# Altium footprint library North POLE.PcbLib: 419 footprints (part 22 of 27)
Each footprint in its own frame and in the unit in brackets; x right, y up, seen from the top. Pads: shape width x height; smd on the part's side, far side on the other; paste and mask are expansions set on the pad; w line width, h text height; cw(c..) or ccw(c..) is an arc to the next point about the centre after c.
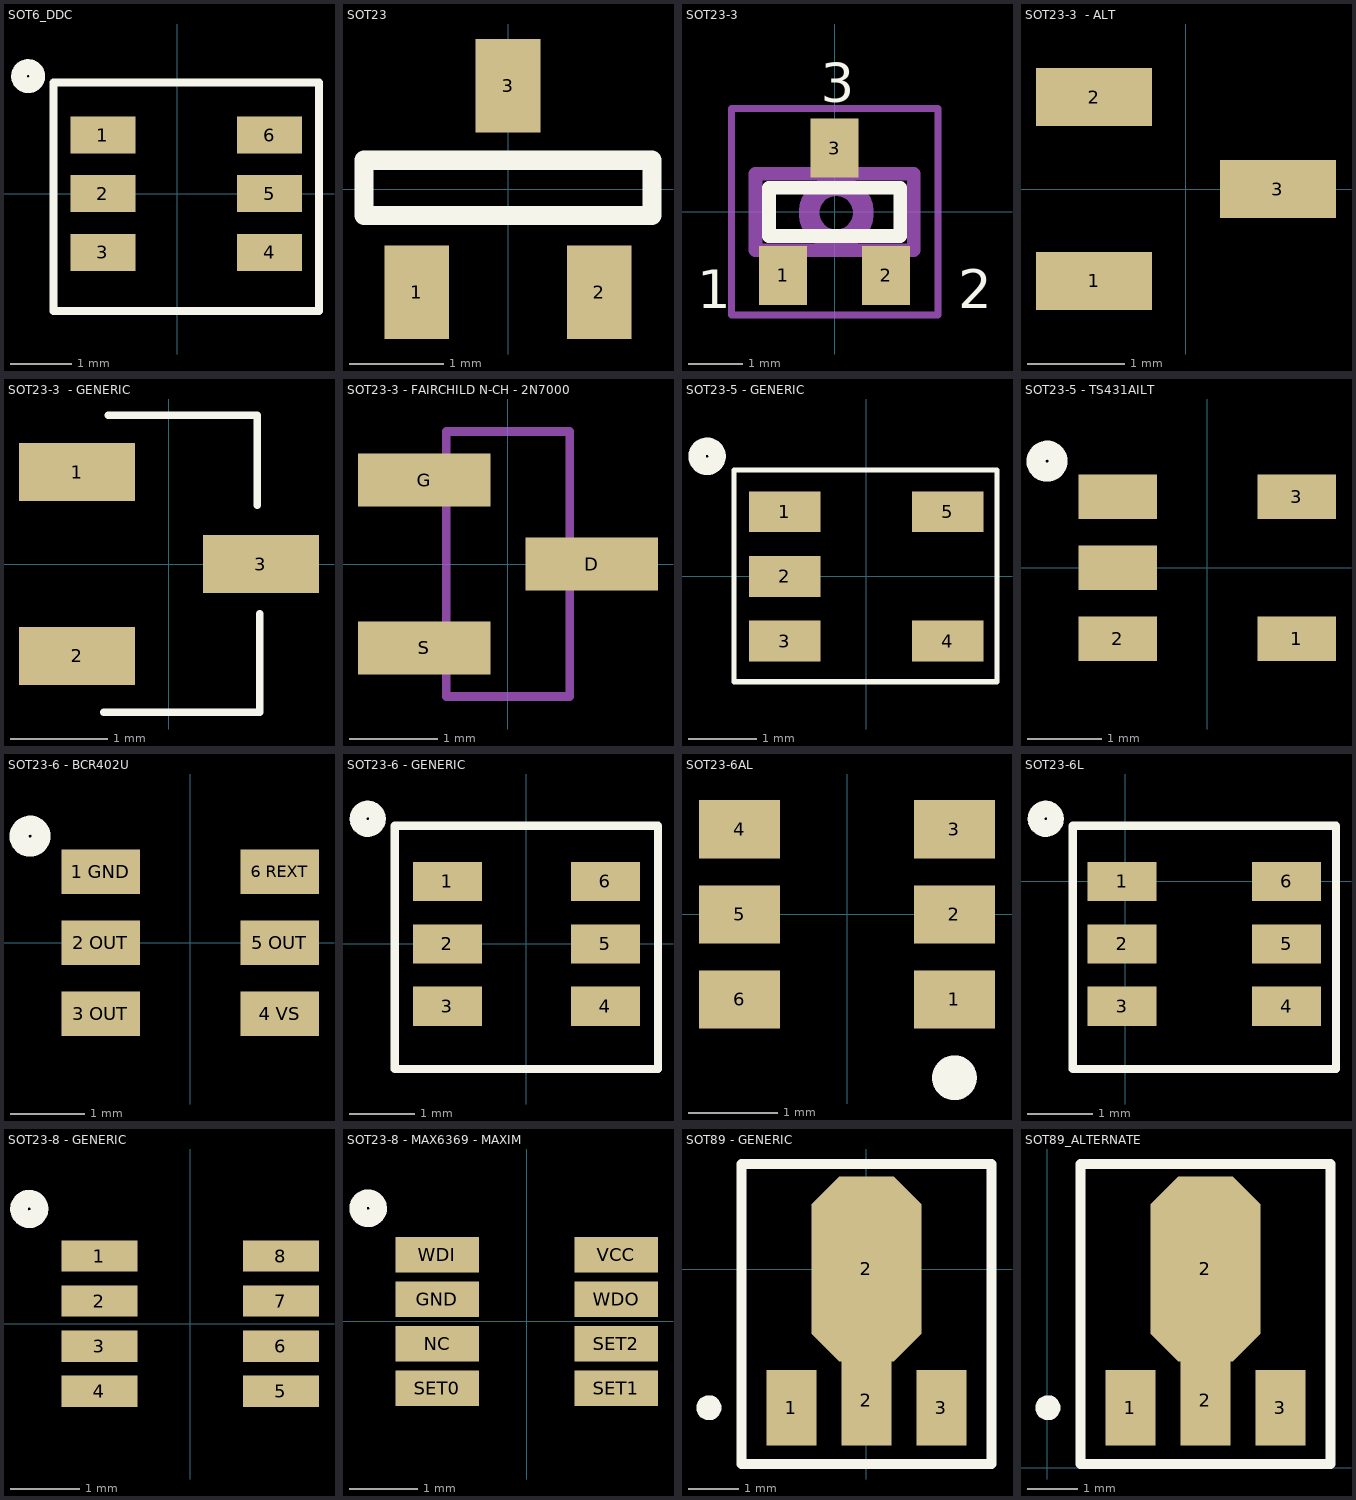
[diagram p21: the footprints below, top view; thin cyan lines are the x and y axes]

## SOT6_DDC [mm]
pads (6):
  rect 1.05x0.6 smd: 1(-1.2,0.95) 2(-1.2,0) 3(-1.2,-0.95) 4(1.5,-0.95) 5(1.5,0.001) 6(1.5,0.95)
Top Overlay:
  lines w0.127: -2,-1.9 2.3,-1.9 2.3,1.8 -2,1.8 -2,-1.9
  lines w0.254: -2.322,2.021 ccw(c-2.412,1.904) -2.3,2
3D body: height 1.3, standoff 0, extent -1.35,-1.5 1.65,1.5

## SOT23 [mil]
pads (3):
  rect 27x39 smd paste-4 mask+5: 1(-38,-43) 2(38,-43) 3(0,43)
Top Overlay:
  lines w8: -60,-11 60,-11 60,12 -60,12 -60,-11
3D body: height 41.34, standoff -1.97, extent -58.06,-47.21 60.05,51.21

## SOT23-3 [mil]
pads (3):
  rect 35x43 smd paste-5 mask+10: 1(-37.4,-46.26) 2(37.4,-46.26) 3(0,46.26)
Top Overlay:
  lines w10: -47.64,-17.72 -47.64,17.32 47.64,17.32 47.64,-17.72 -47.64,-17.72
  text "3" at -10,80 h28
  text "2" at 90,-70 h28
  text "1" at -100,-70 h28
Mechanical 5:
  lines w5: -75,-75 -75,75 75,75 75,-75 -75,-75
Mechanical 6:
  lines w10: -57.48,-27.95 -57.48,27.56 57.48,27.56 57.48,-27.95 -57.48,-27.95
Mechanical 7:
  lines w15: 1.18,-20.47 ccw(c1.18,-0.79) 1.18,18.9 ccw(c1.18,-0.79) 1.18,-20.47

## SOT23-3  - ALT [mm]
pads (3):
  rect 1.2x0.6 smd: 1(-0.95,-0.95) 2(-0.95,0.95) 3(0.95,0)
3D body: height 1.05, standoff 0.03, extent -1.25,-1.46 1.226,1.46

## SOT23-3  - GENERIC [mm]
pads (3):
  rect 1.2x0.6 smd: 1(-0.95,0.95) 2(-0.95,-0.95) 3(0.95,0)
Top Overlay:
  lines w0.076: -0.675,-1.533 0.938,-1.533 0.938,-0.514 ; -0.626,1.536 0.912,1.536 0.912,0.607
3D body: height 1.05, standoff 0.03, extent -1.25,-1.46 1.226,1.46

## SOT23-3 - FAIRCHILD N-CH - 2N7000 [mm]
pads (3):
  rect 1.5x0.6 smd: D(0.95,0) G(-0.95,0.95) S(-0.95,-0.95)
Mechanical 13:
  lines w0.1: -0.7,-1.5 -0.7,1.5 0.7,1.5 0.7,-1.5 -0.7,-1.5
3D body: height 1.1, standoff 0, extent -0.7,-1.5 0.7,1.5

## SOT23-5 - GENERIC [mm]
pads (5):
  rect 1.05x0.6 smd: 1(-1.2,0.95) 2(-1.2,0) 3(-1.2,-0.95) 4(1.2,-0.95) 5(1.2,0.95)
Top Overlay:
  lines w0.076: -1.943,-1.548 -1.943,1.563 1.921,1.563 1.921,-1.548 -1.943,-1.548
  lines w0.254: -2.249,1.882 ccw(c-2.339,1.765) -2.227,1.861
3D body: height 1.3, standoff 0, extent -1.5,-1.499 1.5,1.501

## SOT23-5 - TS431AILT [mm]
pads (5):
  rect 1.05x0.6 smd: 1(1.2,-0.95) 2(-1.2,-0.95) 3(1.2,0.95) ""(-1.2,0) ""(-1.2,0.95)
Top Overlay:
  lines w0.254: -2.054,1.545 ccw(c-2.144,1.428) -2.032,1.524
3D body: height 1.3, standoff 0, extent -1.5,-1.499 1.5,1.501

## SOT23-6 - BCR402U [mm]
pads (6):
  rect 1.05x0.6 smd: "1 GND"(-1.2,0.95) "2 OUT"(-1.2,0) "3 OUT"(-1.2,-0.95) "4 VS"(1.2,-0.95) "5 OUT"(1.2,0) "6 REXT"(1.2,0.95)
Top Overlay:
  lines w0.254: -2.054,1.545 ccw(c-2.144,1.428) -2.032,1.524
3D body: height 1.3, standoff 0, extent -1.5,-1.499 1.5,1.501

## SOT23-6 - GENERIC [mm]
pads (6):
  rect 1.05x0.6 smd: 1(-1.2,0.95) 2(-1.2,0) 3(-1.2,-0.95) 4(1.2,-0.95) 5(1.2,0) 6(1.2,0.95)
Top Overlay:
  lines w0.127: -2,-1.9 2,-1.9 2,1.8 -2,1.8 -2,-1.9
  lines w0.254: -2.322,2.021 ccw(c-2.412,1.904) -2.3,2
3D body: height 1.3, standoff 0, extent -1.5,-1.499 1.5,1.501

## SOT23-6AL [mm] "SOT23, 5-Leads, Body 2.9x1.6mm, Pitch 0.95mm, Lead Span 2.8mm, IPC High Density"
height 1.45
pads (6):
  rect 0.9x0.65 smd: 1(1.2,-0.95) 2(1.2,0) 3(1.2,0.95) 4(-1.2,0.95) 5(-1.2,0) 6(-1.2,-0.95)
Top Overlay:
  circle w0.25: c1.2,-1.825 r0.125
3D body: height 1.45, standoff 0, extent -1.55,-0.9 1.55,0.9

## SOT23-6L [mm]
pads (6):
  rect 1.05x0.6 smd: 1(-0.05,0) 2(-0.05,-0.95) 3(-0.05,-1.9) 4(2.45,-1.9) 5(2.45,-0.95) 6(2.45,0)
Top Overlay:
  lines w0.127: -0.8,-2.85 -0.8,0.85 3.2,0.85 3.2,-2.85 -0.8,-2.85
  lines w0.254: -1.122,1.071 ccw(c-1.212,0.954) -1.1,1.05
3D body: height 1.3, standoff 0, extent -0.3,-2.449 2.7,0.551

## SOT23-8 - GENERIC [mm]
pads (8):
  rect 1.1x0.45 smd: 1(-1.31,0.975) 2(-1.31,0.325) 3(-1.31,-0.325) 4(-1.31,-0.975) 5(1.31,-0.975) 6(1.31,-0.325) 7(1.31,0.325) 8(1.31,0.975)
Top Overlay:
  lines w0.254: -2.231,1.773 ccw(c-2.322,1.656) -2.21,1.753
3D body: height 1, standoff 0, extent -1.4,-1.45 1.4,1.45

## SOT23-8 - MAX6369 - MAXIM [mm]
pads (8):
  rect 1.22x0.52 smd: GND(-1.31,0.325) NC(-1.31,-0.325) SET0(-1.31,-0.975) SET1(1.31,-0.975) SET2(1.31,-0.325) VCC(1.31,0.975) WDI(-1.31,0.975) WDO(1.31,0.325)
Top Overlay:
  lines w0.254: -2.231,1.773 ccw(c-2.322,1.656) -2.21,1.753

## SOT89 - GENERIC [mm]
pads (4):
  rect 1x1.5 smd: 1(-1.501,-2.774) 3(1.499,-2.774)
  oct 2.2x3.7 smd: 2(-0.001,0.001)
  rect 1x1.8 smd: 2(-0.001,-2.624)
Top Overlay:
  circle w0.25: c-3.151,-2.774 r0.125
  lines w0.2: -2.501,-3.899 -2.501,2.101 2.499,2.101 2.499,-3.899 -2.501,-3.899

## SOT89_ALTERNATE [mm]
pads (4):
  rect 1x1.5 smd: 1(1.667,1.199) 3(4.667,1.199)
  oct 2.2x3.7 smd: 2(3.167,3.974)
  rect 1x1.8 smd: 2(3.167,1.349)
Top Overlay:
  circle w0.25: c0.017,1.199 r0.125
  lines w0.2: 0.667,0.074 0.667,6.074 5.667,6.074 5.667,0.074 0.667,0.074